# Altium footprint library PCBLIB.PcbLib: 775 footprints (part 9 of 49)
Each footprint in its own frame and in the unit in brackets; x right, y up, seen from the top. Pads: shape width x height; smd on the part's side, far side on the other; paste and mask are expansions set on the pad; w line width, h text height; cw(c..) or ccw(c..) is an arc to the next point about the centre after c.
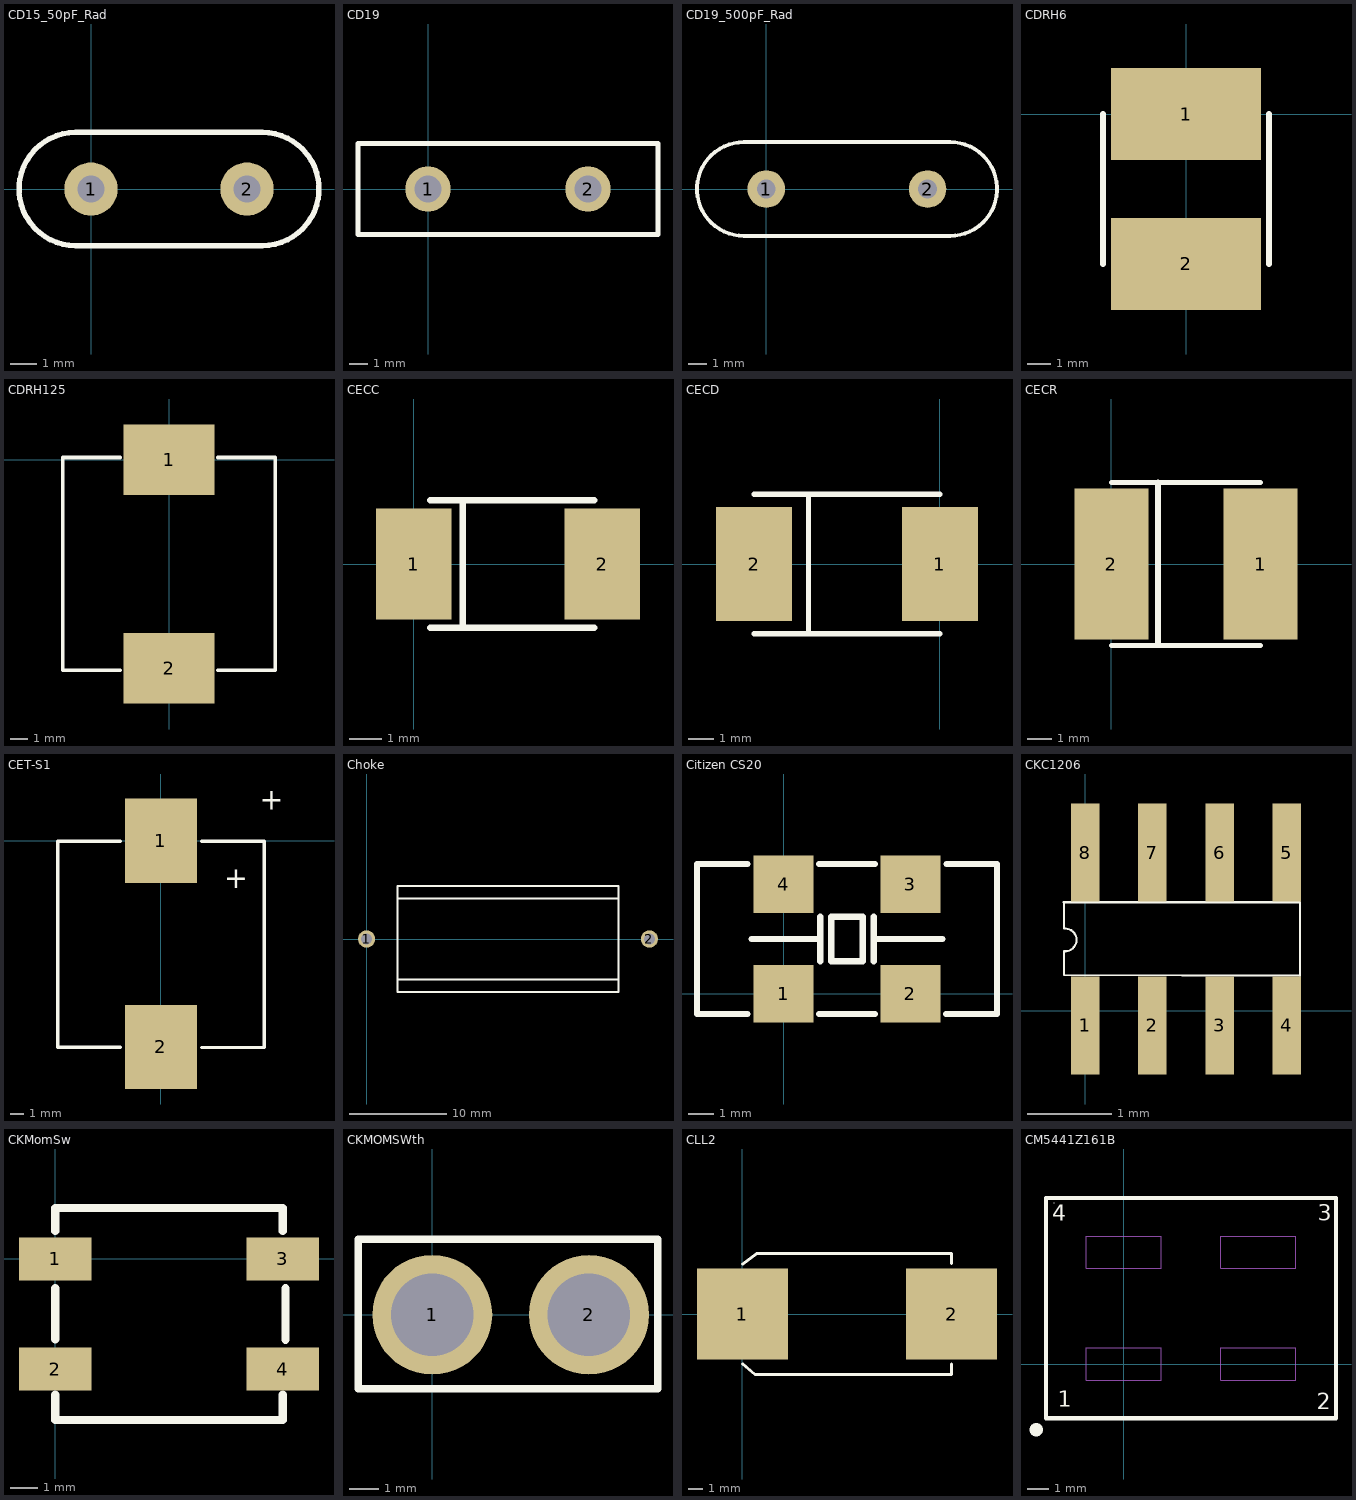
[diagram p8: the footprints below, top view; thin cyan lines are the x and y axes]

## CD15_50pF_Rad [mil]
pads (2):
  round 80 hole 40: 1(0,0) 2(234,0)
TopOverlay:
  lines w8: 257,-85 -23.23,-85 cw(c-23,0) -23.23,85 257,85 ; 257,-84.94 ccw(c257,0.06) 257,85.06

## CD19 [mm]
pads (2):
  round 2.5 hole 1.5: 1(0,0) 2(8.8,0)
TopOverlay:
  lines w0.254: -3.85,-2.5 -3.85,2.5 12.65,2.5 12.65,-2.5 -3.85,-2.5

## CD19_500pF_Rad [mil]
pads (2):
  round 80 hole 40: 1(0,0) 2(344,0)
TopOverlay:
  lines w8: 391.94,-100 -48,-100 cw(c-47.73,0) -48,100 392.06,100 ; 392,-99.94 ccw(c392.01,0.06) 392,100.06

## CDRH6 [mm]
pads (2):
  rect 6.5x4 smd: 1(0,0) 2(0,-6.5)
TopOverlay:
  lines w0.254: -3.6,-6.5 -3.6,0 ; 3.6,-6.5 3.6,0
Mechanical4:
  text ".100" at 0,0 h0.03

## CDRH125 [mil]
height 236
pads (2):
  rect 207x160 smd: 1(0,0) 2(0,-472.44)
TopOverlay:
  lines w8: -110,-477 -241,-477 -241,5 -110,5 ; 110,-477 241,-477 241,5 110,5

## CECC [mil]
height 100
pads (2):
  rect 92x136 smd: 1(0,0) 2(230,0)
TopOverlay:
  lines w8: 20,-78 220,-78 ; 20,78 220,78 ; 60,-77 60,78
Mechanical4:
  text ".110" at -20,0 h1

## CECD [mil]
pads (2):
  rect 120x180 smd: 1(0,0) 2(-293,0)
TopOverlay:
  lines w8: -293,-110 0,-110 ; -293,110 0,110 ; -207,-109 -207,110

## CECR [mil]
pads (2):
  rect 120x246 smd: 1(243,0) 2(0,0)
TopOverlay:
  lines w8: 0,-133 243,-133 ; 0,133 243,133
  lines w10: 76,-132 76,133

## CET-S1 [mm]
pads (2):
  rect 5.3x6.2 smd: 1(0,0) 2(0,-15.2)
TopOverlay:
  lines w0.254: -3,-15.22 -7.6,-15.22 -7.6,-0.025 -3,-0.025 ; 3,-15.24 7.595,-15.24 ; 3,-0.025 7.6,-0.025 7.6,-15.235
  text "+" at 7.264,2.286 h1.52
  text "+" at 4.674,-3.505 h1.52
Mechanical4:
  text ".335" at 0,0 h0.03

## Choke [mil] "Choke used for beacon antenna"
pads (2):
  round 70 hole 45: 1(0,0) 2(1150,0)
TopOverlay:
  lines w8: 125,-215 1025,-215 ; 125,-214 125,215 1025,215 1025,-213 ; 125,-165 1025,-165 ; 125,165 1025,165

## Citizen CS20 [mm] "Citizen CS20 Crystal"
height 2
pads (4):
  rect 2.4x2.3 smd: 1(0,0) 2(5.08,0) 3(5.08,4.4) 4(0,4.4)
TopOverlay:
  lines w0.254: -1.451,5.2 -3.46,5.2 -3.46,-0.8 -1.448,-0.8 ; -1.27,2.2 1.473,2.2 ; 1.422,-0.8 3.658,-0.8 ; 1.422,5.2 3.658,5.2 ; 1.473,1.311 1.473,3.089 ; 3.175,1.311 1.905,1.311 1.905,3.089 3.175,3.089 3.175,1.362 ; 3.607,1.311 3.607,3.089 ; 3.607,2.2 6.35,2.2 ; 6.505,-0.8 8.54,-0.8 8.54,5.2 6.531,5.2
Mechanical4:
  text ".181" at 0,0 h0.03

## CKC1206 [mil]
pads (8):
  rect 13.39x46 smd: 1(0,-7) 2(31.5,-7) 3(62.99,-7) 4(94.49,-7) 5(94.49,74) 6(63.04,74) 7(31.5,74) 8(0,74)
TopOverlay:
  lines w1: -10,50.7 100.6,50.7 ; -9.9,27.7 -9.9,16.6 100.6,16.3 ; -9.89,27.75 ccw(c-9.36,33.06) -9.91,38.37 ; -9.9,38.4 -9.9,50.8 ; 100.6,16.4 100.6,50.8

## CKMomSw [mil]
pads (4):
  rect 104x62 smd: 1(0,0) 2(0,-158) 3(326,0) 4(326,-158)
TopOverlay:
  lines w12: 0,-195 0,-231 326,-231 326,-195 ; 0,-115 0,-42 ; 0,40 0,73 326,73 326,40 ; 330,-116 330,-42
Mechanical4:
  text ".150" at 0,0 h1

## CKMOMSWth [mil]
pads (2):
  round 160 hole 110: 1(0,0) 2(209,0)
TopOverlay:
  lines w10: -99,-99 -99,101 301,101 301,-99 -99,-99

## CLL2 [mil]
pads (2):
  rect 248x248 smd: 1(0,0) 2(571,0)
TopOverlay:
  lines w8: 0,-136 34,-165 100,-165 571,-165 571,-137 ; 0,136 39,165 100,165 571,165 571,138

## CM5441Z161B [mil]
height 600
TopOverlay:
  lines w1: -130.75,299.85 -129.95,300.64
  lines w8: -145,-101 395,-101 395,309 -145,309 -145,-101
  lines w25: -163.51,-121.96 -162.71,-122.76
  text "4" at -133.15,266.29 h30
  text "3" at 361.36,266.29 h30
  text "2" at 358.96,-84.42 h30
  text "1" at -122.76,-79.62 h30
TopPaste:
  rectangle: 150.1,-29.69 180.16,29.72
  rectangle: 150.1,-59.85 349.82,-29.69
  rectangle: 319.82,-29.69 349.82,29.97
  rectangle: 150.1,29.72 349.82,60.03
  rectangle: -100.06,237.72 100.03,268.02
  rectangle: 149.96,178.41 180.3,237.9
  rectangle: 149.96,148.1 349.83,178.41
  rectangle: 319.62,178.41 349.83,237.76
  rectangle: 150,237.76 349.83,268.02
  rectangle: -100.06,178.16 -69.72,237.97
  rectangle: -100.06,148.12 100.12,178.16
  rectangle: 69.52,178.26 100.08,237.98
  rectangle: -100.23,-59.79 100.55,-29.77
  rectangle: -100.17,-29.77 -69.76,29.9
  rectangle: -100.17,29.9 100.55,60.01
  rectangle: 69.98,-29.77 100.55,30
BottomPaste:
  rectangle: 150.14,-29.84 180.14,30.07
  rectangle: 150.15,-59.84 349.87,-29.84
  rectangle: 319.87,-29.84 349.87,29.97
  rectangle: 150.14,29.97 349.87,60.07
  rectangle: -100.18,30.01 100.58,60.01
  rectangle: 70.53,-29.86 100.53,30.01
  rectangle: -100.18,-59.86 100.58,-29.86
  rectangle: -100.18,-29.86 -70.18,30.01
  rectangle: -100.06,237.72 100.03,268.05
  rectangle: -100.06,148.12 -70.06,238.04
  rectangle: -70.06,148.12 100.08,178.02
  rectangle: 69.47,177.72 100.08,238.03
  rectangle: 150.07,237.97 349.8,267.97
  rectangle: 319.8,178.16 349.8,237.97
  rectangle: 150.07,148.16 349.8,178.16
  rectangle: 150.07,178.16 180.07,238.01
TopSolder:
  rectangle: 150.06,-29.64 180.16,29.77
  rectangle: 150.06,-59.8 349.77,-29.64
  rectangle: 319.72,-29.64 349.82,29.77
  rectangle: 150.06,29.77 349.82,60.18
  rectangle: 149.95,178.36 180.31,237.62
  rectangle: 149.95,148.11 349.75,178.36
  rectangle: 319.6,178.36 349.75,237.62
  rectangle: 149.95,237.62 349.75,268.08
  rectangle: -100.05,178.21 -69.62,237.72
  rectangle: -100.05,148.1 100.03,178.26
  rectangle: 69.45,178.26 100.03,237.72
  rectangle: -100.05,237.78 100.08,268.05
  rectangle: -100.23,30 100.55,60.01
  rectangle: 69.98,-29.77 100.55,29.9
  rectangle: -100.23,-59.79 100.55,-29.77
  rectangle: -100.23,-29.77 -69.76,29.9
BottomSolder:
  rectangle: 150.06,-29.64 180.16,29.77
  rectangle: 150.06,-59.8 349.77,-29.64
  rectangle: 319.72,-29.64 349.82,29.77
  rectangle: 150.06,29.77 349.82,60.18
  rectangle: 149.95,178.36 180.31,237.62
  rectangle: 149.95,148.11 349.75,178.36
  rectangle: 319.6,178.36 349.75,237.62
  rectangle: 149.95,237.62 349.75,268.08
  rectangle: -100.05,178.26 -69.62,237.72
  rectangle: -100.05,148.1 100.08,178.26
  rectangle: 69.45,178.26 100.03,237.72
  rectangle: -100.05,237.72 100.03,268.05
  rectangle: -100.23,-29.77 -69.76,29.9
  rectangle: -100.23,-59.79 100.55,-29.77
  rectangle: 69.98,-29.77 100.55,29.9
  rectangle: -100.23,29.9 100.55,60.01
Mechanical1:
  lines w1: 39,30.01 70.06,30.01 ; 70.06,30.01 -69.78,30.01 -69.78,-29.86 70.06,-29.86 70.06,30.01 ; -70.06,178.5 -69.58,178.02 0.25,178.02 69.23,178.02 69.51,178.31 69.51,237.99 -69.96,237.99 -69.96,178.6 -70.06,178.5 ; 180.02,178.12 319.88,178.12 319.88,237.95 180.22,237.95 180.02,238.14 180.02,178.12 ; 180.12,-29.95 319.97,-29.95 319.97,29.98 180.22,29.98 180.12,30.07 180.12,-29.95
MultiLayer:
  rectangle: -100.05,178.21 -69.62,237.72
  rectangle: -100.05,148.1 100.08,178.26
  rectangle: 69.45,178.26 100.08,237.78
  rectangle: -100.05,237.72 100.03,268.05
  rectangle: 69.98,-29.77 100.55,30
  rectangle: -100.23,-29.77 -69.76,29.9
  rectangle: -100.23,-59.79 100.55,-29.77
  rectangle: -100.23,29.9 100.55,60.01
  rectangle: 149.95,237.62 349.75,268.08
  rectangle: 319.6,178.36 349.75,237.62
  rectangle: 149.95,148.11 349.75,178.36
  rectangle: 149.95,178.36 180.31,237.62
  rectangle: 150.06,29.77 349.82,60.18
  rectangle: 319.72,-29.64 349.82,29.77
  rectangle: 150.06,-59.8 349.77,-29.64
  rectangle: 150.06,-29.64 180.16,29.77